# Altium footprint library Library.PcbLib: 308 footprints (part 12 of 21)
Each footprint in its own frame and in the unit in brackets; x right, y up, seen from the top. Pads: shape width x height; smd on the part's side, far side on the other; paste and mask are expansions set on the pad; w line width, h text height; cw(c..) or ccw(c..) is an arc to the next point about the centre after c.
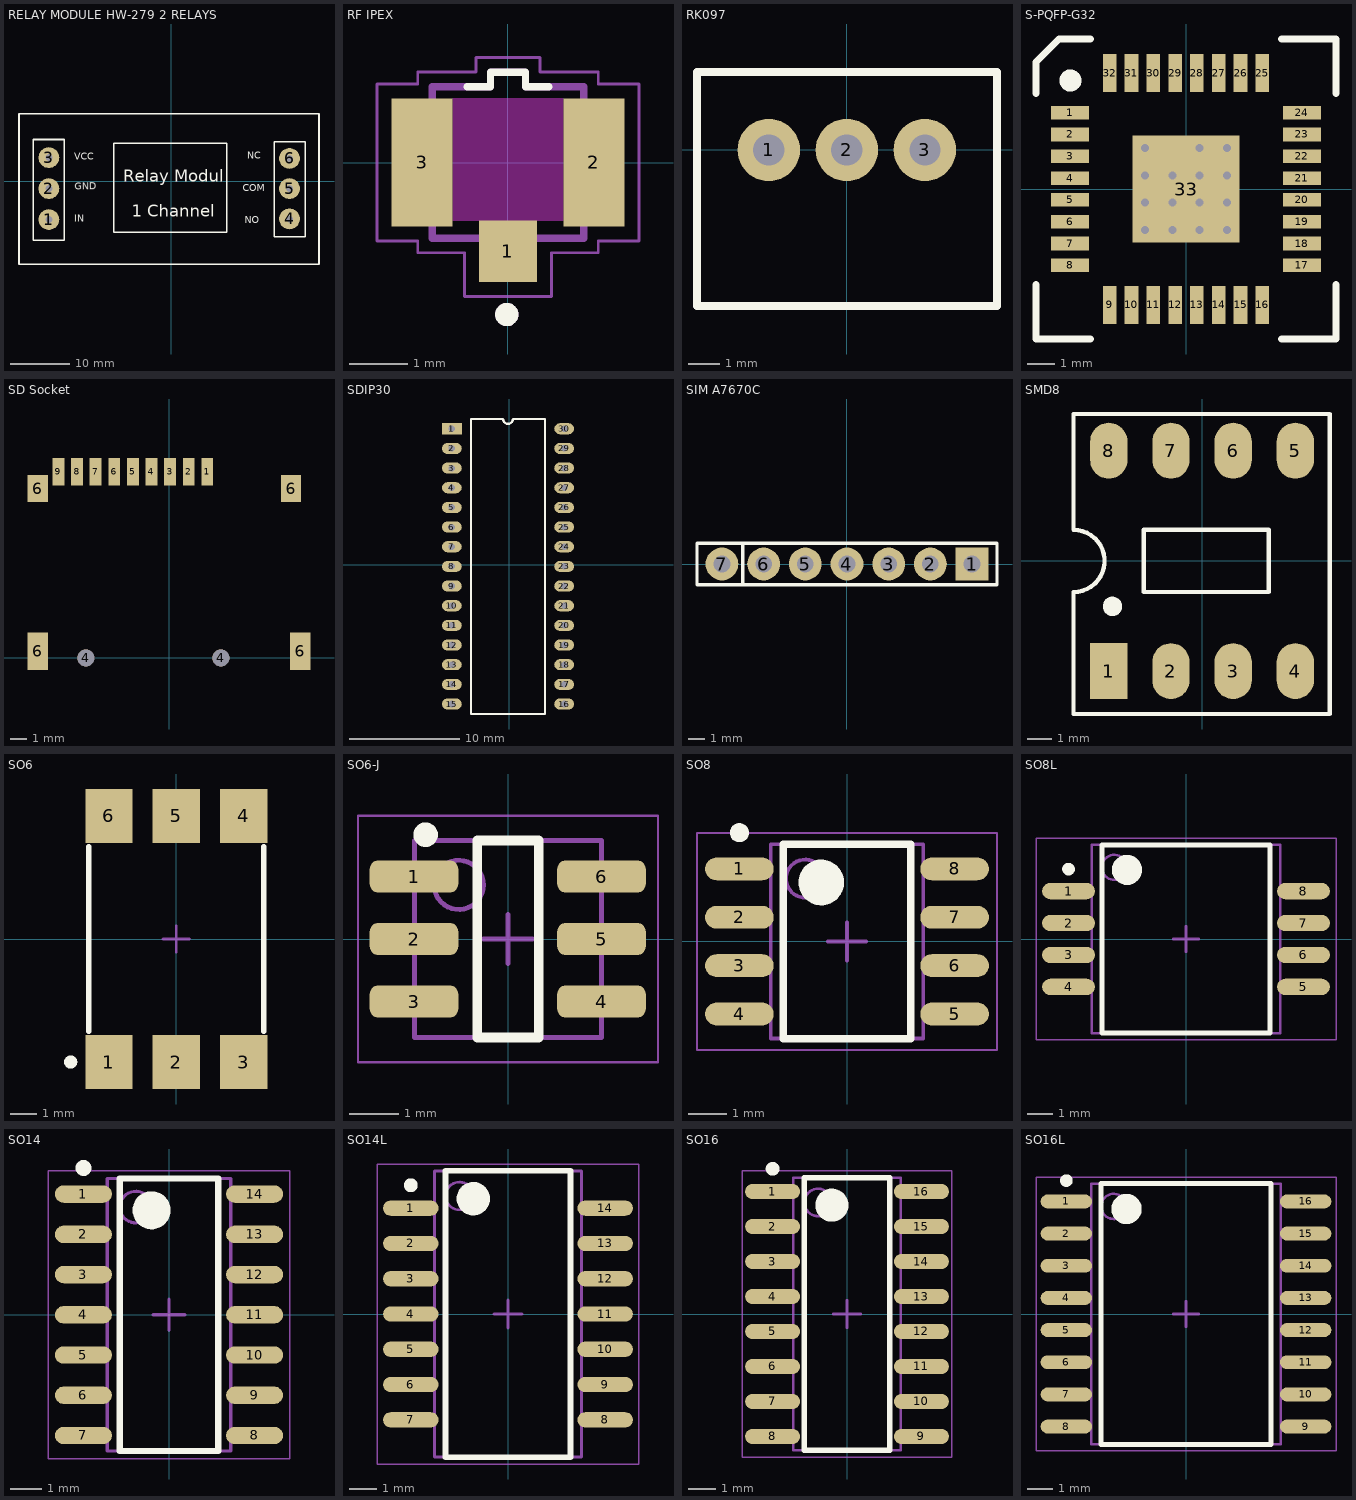
[diagram p11: the footprints below, top view; thin cyan lines are the x and y axes]

## RELAY MODULE HW-279 2 RELAYS [mm]
pads (6):
  round 3.5 hole 1.2: 1(-20.573,-6.473) 2(-20.573,-1.266) 3(-20.573,3.941) 4(19.876,-6.346) 5(19.876,-1.266) 6(19.876,3.814)
Top Overlay:
  lines w0.254: -25.59,-13.966 24.829,-13.966 24.829,11.307 -25.59,11.307 -25.59,-13.966 ; -23.177,-9.902 -17.97,-9.902 -17.97,6.989 -23.177,6.989 -23.177,-9.902 ; -9.69,-8.639 9.31,-8.639 9.31,6.361 -9.69,6.361 -9.69,-8.639 ; 17.336,-9.394 22.543,-9.394 22.543,6.608 17.336,6.608 17.336,-9.394
  text "COM" at 12.002,-2.154 h2.03
  text "NC" at 12.764,3.307 h2.03
  text "NO" at 12.383,-7.488 h2.03
  text "Relay Modul" at -8.064,-0.123 h2.03
  text "1 Channel" at -6.667,-5.965 h2.03
  text "GND" at -16.26,-1.9 h2.03
  text "VCC" at -16.281,3.18 h2.03
  text "IN" at -16.283,-7.278 h2.03
3D body "5v relay.SLDPRT": height 17, standoff -2.19, extent -25.59,-13.993 25.19,11.307

## RF IPEX [mm] "Antenna"
pads (3):
  rect 1x1.05 smd: 1(0,-1.525)
  rect 1.05x2.2 smd: 2(1.475,0) 3(-1.475,0)
Top Overlay:
  circle w0.2: c-0.02,-2.61 r0.1
  lines w0.127: -0.7,1.3 -0.3,1.3 -0.3,1.55 0.3,1.55 0.3,1.3 0.7,1.3
Keep-Out Layer:
  region: 0.95,-1 -0.95,-1 -0.95,1.1 0.95,1.1
Mechanical 13:
  circle w0.2: c-0.02,-2.61 r0.1
  lines w0.127: -1.5,-0.9 -1.5,0.9 -1.3,0.9 -1.3,1.3 -0.3,1.3 -0.3,1.55 0.3,1.55 0.3,1.3 1.3,1.3 1.3,0.9 1.5,0.9 1.5,-0.9 1.3,-0.9 1.3,-1.3 0.3,-1.3 0.3,-1.55 -0.3,-1.55 -0.3,-1.3 -1.3,-1.3 -1.3,-0.9 -1.5,-0.9
Mechanical 15:
  lines w0.05: -2.25,-1.35 -1.55,-1.35 -1.55,-1.55 -0.75,-1.55 -0.75,-2.3 0.75,-2.3 0.75,-1.55 1.55,-1.55 1.55,-1.35 2.25,-1.35 2.25,1.35 1.55,1.35 1.55,1.55 0.55,1.55 0.55,1.8 -0.55,1.8 -0.55,1.55 -1.55,1.55 -1.55,1.35 -2.25,1.35 -2.25,-1.35
3D body "step_temp.STEP": height 1.25, standoff 0, extent -1.5,-1.55 1.5,1.55

## RK097 [mm]
pads (3):
  round 2 hole 1: 1(-2.5,0) 2(0,0) 3(2.5,0)
Top Overlay:
  lines w0.254: -4.8,-5 4.81,-5 4.81,2.5 -4.8,2.5 -4.8,-5
3D body "RD901F-20-15R1.stp": height 11.3, standoff -3.5, extent -4.8,-19.8 4.8,2.5

## S-PQFP-G32 [mm]
pads (33):
  rect 1.4x0.5 smd mask+0.07: 1(-4.25,2.8) 2(-4.25,2) 3(-4.25,1.2) 4(-4.25,0.4) 5(-4.25,-0.4) 6(-4.25,-1.2) 7(-4.25,-2) 8(-4.25,-2.8) 17(4.25,-2.8) 18(4.25,-2) 19(4.25,-1.2) 20(4.25,-0.4) 21(4.25,0.4) 22(4.25,1.2) 23(4.25,2) 24(4.25,2.8)
  rect 0.5x1.4 smd mask+0.07: 9(-2.8,-4.25) 10(-2,-4.25) 11(-1.2,-4.25) 12(-0.4,-4.25) 13(0.4,-4.25) 14(1.2,-4.25) 15(2,-4.25) 16(2.8,-4.25) 25(2.8,4.25) 26(2,4.25) 27(1.2,4.25) 28(0.4,4.25) 29(-0.4,4.25) 30(-1.2,4.25) 31(-2,4.25) 32(-2.8,4.25)
  rect 3.91x3.91 smd mask+0.07: 33(0,0)
via 0.5,1.5 diameter 0.4 hole 0.3
via 0.5,0.5 diameter 0.4 hole 0.3
via 0.5,-0.5 diameter 0.4 hole 0.3
via 0.5,-1.5 diameter 0.4 hole 0.3
via -0.5,0.5 diameter 0.4 hole 0.3
via -0.5,-0.5 diameter 0.4 hole 0.3
via -0.5,-1.5 diameter 0.4 hole 0.3
via 1.5,-0.5 diameter 0.4 hole 0.3
via 1.5,0.5 diameter 0.4 hole 0.3
via 1.5,1.5 diameter 0.4 hole 0.3
via 1.5,-1.5 diameter 0.4 hole 0.3
via -1.5,0.5 diameter 0.4 hole 0.3
via -1.5,-0.5 diameter 0.4 hole 0.3
via -1.5,-1.5 diameter 0.4 hole 0.3
via -1.5,1.5 diameter 0.4 hole 0.3
Top Overlay:
  circle w0.4: c-4.238,3.977 r0.205
  lines w0.254: -5.5,-3.5 -5.5,-5.5 -3.5,-5.5 ; -5.5,3.5 -5.5,4.66 -4.66,5.5 -3.5,5.5 ; 3.5,-5.5 5.5,-5.5 5.5,-3.5 ; 3.5,5.5 5.5,5.5 5.5,3.5
3D body "DRV593VFPR.step": height 1.6, standoff 0, extent -4.5,-4.5 4.5,4.5

## SD Socket [mm]
pads (15):
  rect 0.7x1.6 smd: 1(2.25,11) 2(1.15,11) 3(0.05,11) 4(-1.05,11) 5(-2.15,11) 6(-3.25,11) 7(-4.35,11) 8(-5.45,11) 9(-6.55,11)
  round 1 hole 1: 4(-4.93,0) 4(3.05,0)
  rect 1.2x2.2 smd: 6(-7.78,0.4) 6(7.75,0.4)
  rect 1.2x1.6 smd: 6(-7.78,10) 6(7.2,10)
3D body "xb-xktf-n02-n.stp": height 1.85, standoff -0.6, extent -8.07,-4 8.069,11.194
3D body "User Library-microsd card.step": height 1.7, standoff 0.7, extent -6.584,-20.966 4.428,-5.966

## SDIP30 [mm]
pads (30):
  rect 1.8x1 hole 0.6: 1(-5.207,12.319)
  oval 1.8x1 hole 0.6: 2(-5.207,10.541) 3(-5.207,8.763) 4(-5.207,6.985) 5(-5.207,5.207) 6(-5.207,3.429) 7(-5.207,1.651) 8(-5.207,-0.127) 9(-5.207,-1.905) 10(-5.207,-3.683) 11(-5.207,-5.461) 12(-5.207,-7.239) 13(-5.207,-9.017) 14(-5.207,-10.795) 15(-5.207,-12.573) 16(4.953,-12.573) 17(4.953,-10.795) 18(4.953,-9.017) 19(4.953,-7.239) 20(4.953,-5.461) 21(4.953,-3.683) 22(4.953,-1.905) 23(4.953,-0.127) 24(4.953,1.651) 25(4.953,3.429) 26(4.953,5.207) 27(4.953,6.985) 28(4.953,8.763) 29(4.953,10.541) 30(4.953,12.319)
Top Overlay:
  lines w0.2: -3.472,-13.462 3.218,-13.462 3.218,13.208 0.318,13.208 cw(c-0.127,13.208) -0.572,13.208 -3.472,13.208 -3.472,-13.462
3D body "User Library-ul7aajr_sdip30.STEP": height 4.2, standoff -3.26, extent -5.34,-14.097 5.08,13.843

## SIM A7670C [mm]
pads (7):
  rect 2x2 hole 1.02: 1(7.62,0)
  round 2 hole 1.02: 2(5.08,0) 3(2.54,0) 4(0,0) 5(-2.54,0) 6(-5.08,0) 7(-7.62,0)
Top Overlay:
  lines w0.2: -6.35,-1.27 -6.35,1.27 ; -9.14,-1.27 9.14,-1.27 9.14,1.27 -9.14,1.27 -9.14,-1.27
3D body "SIM.step": height 15.52, standoff 1.57, extent -12.9,-1.4 13.1,26.6
3D body "61300711821.stp": height 8.51, standoff -3.09, extent -9.14,-1.25 9.14,1.25

## SMD8 [mil] "DIP, 8-Leads, Row Spacing 7.62mm, Pitch 2.54mm, Body 9.91x6.73mm"
height 200
pads (8):
  rect 60x90 smd: 1(-150,-177.17)
  oval 60x90 smd: 2(-50,-177.17) 3(50,-177.17) 4(150,-177.17) 5(150,177.17) 6(50,177.17) 7(-50,177.17) 8(-150,177.17)
Top Overlay:
  circle w15: c-144,-73 r8
  lines w7: -206.69,-246.06 205,-246.06 205,236.22 -206.69,236.22 -206.69,50 cw(c-206.69,0) -206.69,-50 -206.69,-246.06 ; -94,-50 -94,50 107,50 107,-50 -94,-50
3D body "VOR2142B8.STEP": height 151.57, standoff 1.97, extent -200,-192.91 200,192.91

## SO6 [mil]
height 200
pads (6):
  rect 70x80 smd: 1(-100,-182.48) 2(0,-182.48) 3(100,-182.48) 5(0,182.48) 6(-100,182.48)
  rect 70x80 smd mask+0: 4(100,182.48)
Top Overlay:
  circle w9.84: c-156.69,-182.48 r4.92
  lines w7.87: -129.92,-136.81 -129.92,136.81 ; 129.92,-136.81 129.92,136.81
Mechanical 15:
  lines w3.94: -19.69,0 19.68,0 ; 0,-19.68 0,19.68
3D body "PC900.stp": height 140.63, standoff 0.14, extent -138.06,-212.03 138.5,211.43

## SO6-J [mm] "SOJ, 6-Leads, Body 4.00x4.30mm, Pitch 1.27mm, IPC Low Density"
height 1.1
pads (6):
  rrect50% 1.8x0.65 smd: 1(-1.91,1.27) 2(-1.91,0) 3(-1.91,-1.27) 4(1.9,-1.27) 5(1.9,0) 6(1.9,1.27)
Top Overlay:
  circle w0.25: c-1.675,2.12 r0.125
  lines w0.2: -0.625,-2 -0.625,2 0.625,2 0.625,-2 -0.625,-2
Mechanical 13:
  circle w0.1: c-1,1.1 r0.5
  lines w0.1: -1.9,-2 -1.9,2 1.9,2 1.9,-2 -1.9,-2
Mechanical 15:
  lines w0.05: -3.048,-2.5 -3.048,2.5 3.048,2.5 3.048,-2.5 -3.048,-2.5
  lines w0.1: -0.5,0 0.5,0 ; 0,-0.5 0,0.5
3D body "SOIC127P490X150-6N.step": height 1.5, standoff 0, extent -2.45,-2 2.45,2

## SO8 [mm] "SOIC, 8-Leads, Body 4.9x3.9mm, Pitch 1.27mm, IPC High Density"
pads (8):
  oval 1.8x0.6 smd: 1(-2.825,1.905) 2(-2.825,0.635) 3(-2.825,-0.635) 4(-2.825,-1.905) 5(2.825,-1.905) 6(2.825,-0.635) 7(2.825,0.635) 8(2.825,1.905)
Top Overlay:
  circle w0.6: c-0.675,1.55 r0.3
  circle w0.25: c-2.825,2.855 r0.125
  lines w0.2: -1.675,-2.55 1.675,-2.55 1.675,2.55 -1.675,2.55 -1.675,-2.55
Mechanical 13:
  circle w0.1: c-1.1,1.65 r0.5
  lines w0.1: -2,-2.55 2,-2.55 2,2.55 -2,2.55 -2,-2.55
Mechanical 15:
  lines w0.05: -3.937,-2.85 3.937,-2.85 3.937,2.85 -3.937,2.85 -3.937,-2.85
  lines w0.1: -0.5,0 0.5,0 ; 0,-0.5 0,0.5
3D body "CircuitWorks-SO-8 (PIC12FXXX).step": height 1.6, standoff 0, extent -2.995,-2.45 2.995,2.45

## SO8L [mm] "SOIC, 8-Leads, Body 7.50x7.50mm, Pitch 1.27mm, IPC Medium Density"
height 1.5
pads (8):
  oval 2.1x0.65 smd: 1(-4.675,1.905) 2(-4.675,0.635) 3(-4.675,-0.635) 4(-4.675,-1.905) 5(4.675,-1.905) 6(4.675,-0.635) 7(4.675,0.635) 8(4.675,1.905)
Top Overlay:
  circle w0.25: c-4.675,2.78 r0.125
  circle w0.6: c-2.35,2.75 r0.3
  lines w0.2: -3.35,-3.75 -3.35,3.75 3.35,3.75 3.35,-3.75 -3.35,-3.75
Mechanical 13:
  circle w0.1: c-2.85,2.85 r0.5
  lines w0.1: -3.75,-3.75 -3.75,3.75 3.75,3.75 3.75,-3.75 -3.75,-3.75
Mechanical 15:
  lines w0.05: -5.969,-4 -5.969,4 5.969,4 5.969,-4 -5.969,-4
  lines w0.1: -0.5,0 0.5,0 ; 0,-0.5 0,0.5
3D body "SOIC127P1000X150-8N.step": height 1.5, standoff 0, extent -5,-3.65 5,3.65

## SO14 [mm] "SOIC, 14-Leads, Body 8.60x3.90mm, Pitch 1.27mm, IPC Medium Density"
height 1.75
pads (14):
  oval 1.8x0.55 smd: 1(-2.7,3.81) 2(-2.7,2.54) 3(-2.7,1.27) 4(-2.7,0) 5(-2.7,-1.27) 6(-2.7,-2.54) 7(-2.7,-3.81) 8(2.7,-3.81) 9(2.7,-2.54) 10(2.7,-1.27) 11(2.7,0) 12(2.7,1.27) 13(2.7,2.54) 14(2.7,3.81)
Top Overlay:
  circle w0.25: c-2.7,4.635 r0.125
  circle w0.6: c-0.55,3.3 r0.3
  lines w0.2: -1.55,-4.3 -1.55,4.3 1.55,4.3 1.55,-4.3 -1.55,-4.3
Mechanical 13:
  circle w0.1: c-1.05,3.4 r0.5
  lines w0.1: -1.95,-4.3 -1.95,4.3 1.95,4.3 1.95,-4.3 -1.95,-4.3
Mechanical 15:
  lines w0.05: -3.81,-4.55 -3.81,4.55 3.81,4.55 3.81,-4.55 -3.81,-4.55
  lines w0.1: -0.5,0 0.5,0 ; 0,-0.5 0,0.5
3D body "SOIC127P600X175-14N.step": height 1.75, standoff 0, extent -2.873,-4.3 3.127,4.3

## SO14L [mm] "SOIC, 14-Leads, Body 10.30x5.30mm, Pitch 1.27mm, IPC Medium Density"
height 2
pads (14):
  oval 2x0.55 smd: 1(-3.5,3.81) 2(-3.5,2.54) 3(-3.5,1.27) 4(-3.5,0) 5(-3.5,-1.27) 6(-3.5,-2.54) 7(-3.5,-3.81) 8(3.5,-3.81) 9(3.5,-2.54) 10(3.5,-1.27) 11(3.5,0) 12(3.5,1.27) 13(3.5,2.54) 14(3.5,3.81)
Top Overlay:
  circle w0.6: c-1.25,4.15 r0.3
  circle w0.25: c-3.5,4.635 r0.125
  lines w0.2: -2.25,-5.15 2.25,-5.15 2.25,5.15 -2.25,5.15 -2.25,-5.15
Mechanical 13:
  circle w0.1: c-1.75,4.25 r0.5
  lines w0.1: -2.65,-5.15 2.65,-5.15 2.65,5.15 -2.65,5.15 -2.65,-5.15
Mechanical 15:
  lines w0.05: -4.699,-5.4 4.699,-5.4 4.699,5.4 -4.699,5.4 -4.699,-5.4
  lines w0.1: -0.5,0 0.5,0 ; 0,-0.5 0,0.5
3D body "SOIC127P760X150-14N.step": height 1.5, standoff 0, extent -3.81,-5.15 3.81,5.15

## SO16 [mm] "SOIC, 16-Leads, Body 9.90x3.91mm, Pitch 1.27mm, IPC Medium Density"
height 1.75
pads (16):
  oval 2x0.55 smd: 1(-2.7,4.445) 2(-2.7,3.175) 3(-2.7,1.905) 4(-2.7,0.635) 5(-2.7,-0.635) 6(-2.7,-1.905) 7(-2.7,-3.175) 8(-2.7,-4.445) 9(2.7,-4.445) 10(2.7,-3.175) 11(2.7,-1.905) 12(2.7,-0.635) 13(2.7,0.635) 14(2.7,1.905) 15(2.7,3.175) 16(2.7,4.445)
Top Overlay:
  circle w0.6: c-0.55,3.95 r0.3
  circle w0.25: c-2.7,5.27 r0.125
  lines w0.2: -1.55,-4.95 1.55,-4.95 1.55,4.95 -1.55,4.95 -1.55,-4.95
Mechanical 13:
  circle w0.1: c-1.05,4.05 r0.5
  lines w0.1: -1.95,-4.95 1.95,-4.95 1.95,4.95 -1.95,4.95 -1.95,-4.95
Mechanical 15:
  lines w0.05: -3.81,-5.2 3.81,-5.2 3.81,5.2 -3.81,5.2 -3.81,-5.2
  lines w0.1: -0.5,0 0.5,0 ; 0,-0.5 0,0.5
3D body "User Library-SOIC-16-1.step": height 1.4, standoff 0, extent -3,-4.95 3,4.95

## SO16L [mm] "SOIC, 16-Leads, Body 10.30x7.50mm, Pitch 1.27mm, IPC Medium Density"
height 2.4
pads (16):
  oval 2.032x0.55 smd: 1(-4.725,4.445) 2(-4.725,3.175) 3(-4.725,1.905) 4(-4.725,0.635) 5(-4.725,-0.635) 6(-4.725,-1.905) 7(-4.725,-3.175) 8(-4.725,-4.445) 9(4.725,-4.445) 10(4.725,-3.175) 11(4.725,-1.905) 12(4.725,-0.635) 13(4.725,0.635) 14(4.725,1.905) 15(4.725,3.175) 16(4.725,4.445)
Top Overlay:
  circle w0.6: c-2.35,4.15 r0.3
  circle w0.25: c-4.725,5.27 r0.125
  lines w0.2: -3.35,-5.15 3.35,-5.15 3.35,5.15 -3.35,5.15 -3.35,-5.15
Mechanical 13:
  circle w0.1: c-2.85,4.25 r0.5
  lines w0.1: -3.75,-5.15 3.75,-5.15 3.75,5.15 -3.75,5.15 -3.75,-5.15
Mechanical 15:
  lines w0.05: -5.925,-5.4 5.925,-5.4 5.925,5.4 -5.925,5.4 -5.925,-5.4
  lines w0.1: -0.5,0 0.5,0 ; 0,-0.5 0,0.5
3D body "User Library-SO-16W.STEP": height 2.48, standoff 0, extent -5.155,-5.165 5.155,5.165